# Altium footprint library ssmaster_1.PcbLib: 27 footprints (part 1 of 2)
Each footprint in its own frame and in the unit in brackets; x right, y up, seen from the top. Pads: shape width x height; smd on the part's side, far side on the other; paste and mask are expansions set on the pad; w line width, h text height; cw(c..) or ccw(c..) is an arc to the next point about the centre after c.
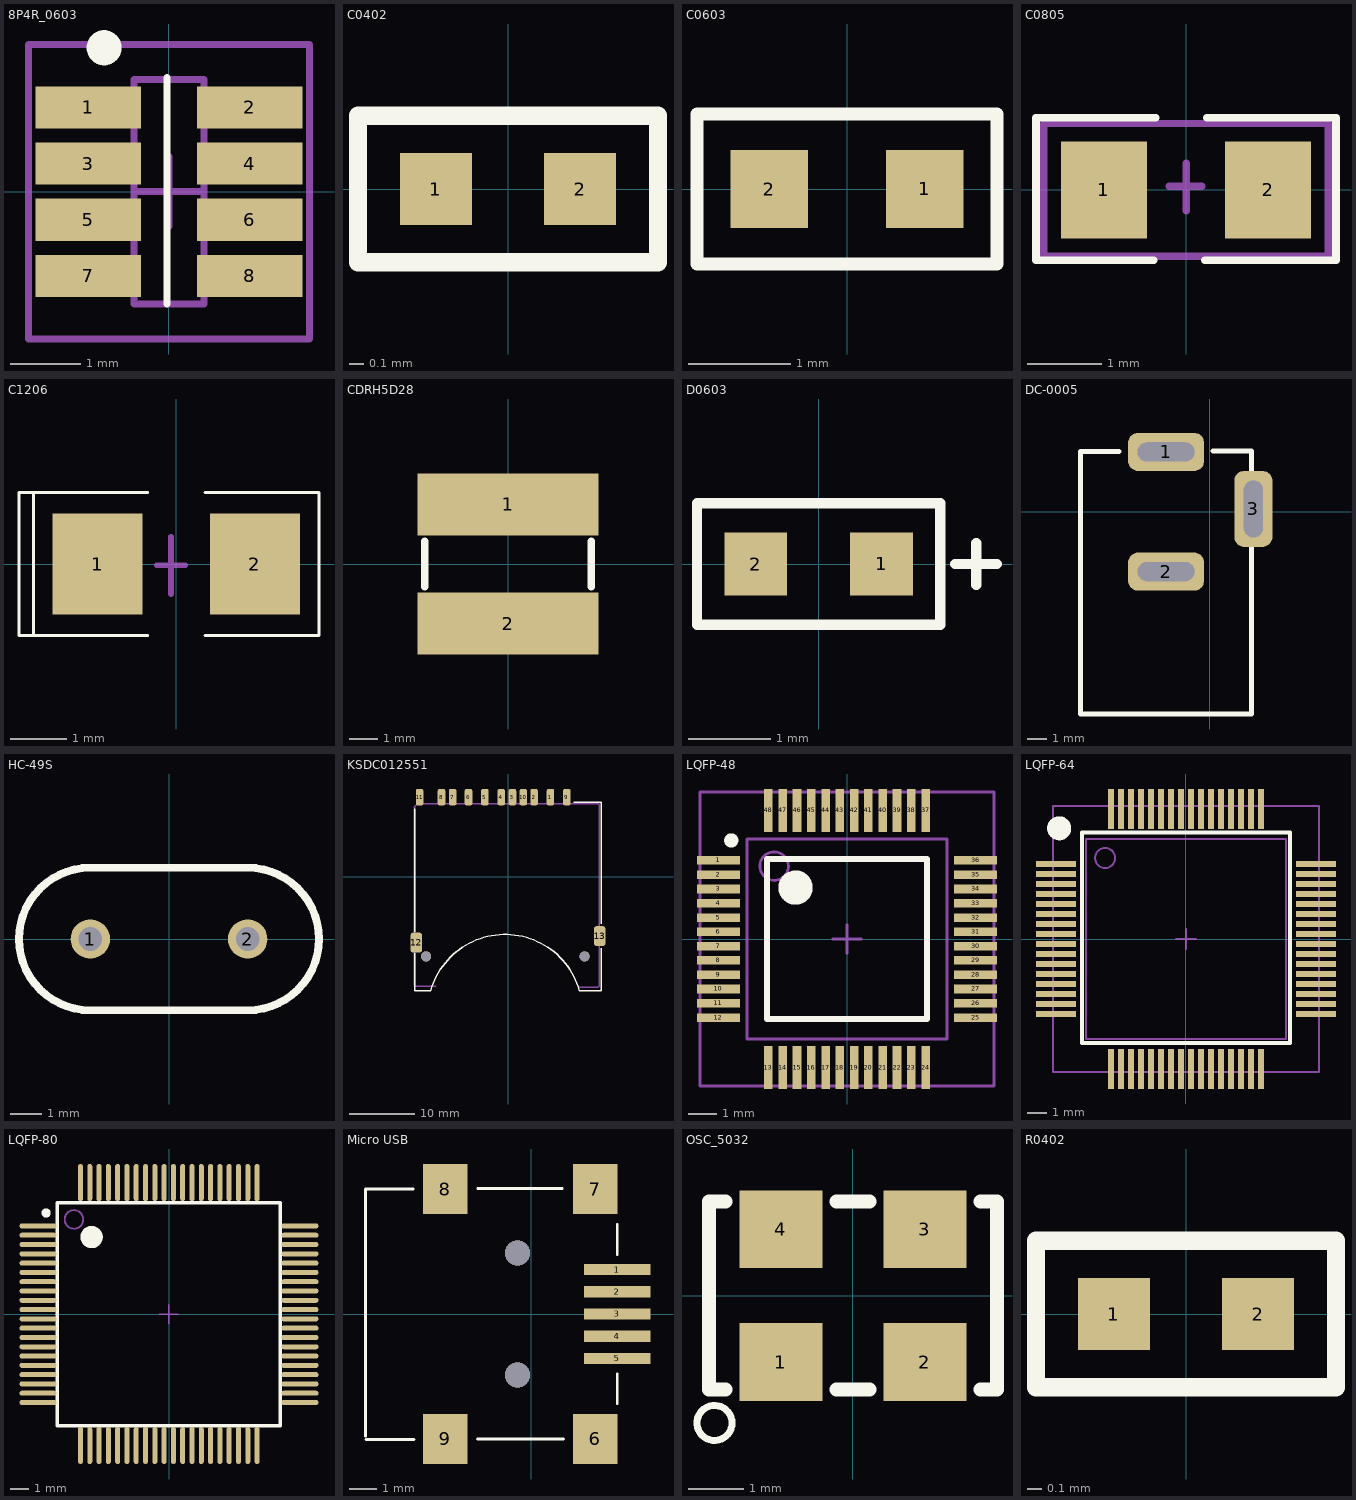
[diagram p0: the footprints below, top view; thin cyan lines are the x and y axes]

## 8P4R_0603 [mm]
pads (8):
  rect 1.5x0.6 smd: 1(-1.15,1.2) 2(1.15,1.2) 3(-1.15,0.4) 4(1.15,0.4) 5(-1.15,-0.4) 6(1.15,-0.4) 7(-1.15,-1.2) 8(1.15,-1.2)
Top Overlay:
  circle w0.25: c-0.925,2.05 r0.125
  lines w0.1: -0.025,-1.6 -0.025,1.626
Mechanical 13:
  lines w0.1: -0.5,-1.6 0.5,-1.6 0.5,1.6 -0.5,1.6 -0.5,-1.6
Mechanical 15:
  lines w0.1: -0.5,0 0.5,0 ; 0,-0.5 0,0.5 ; -2,-2.1 2,-2.1 2,2.1 -2,2.1 -2,-2.1
3D body: height 0.6, standoff 0.5, extent 0.483,-1.473 0.838,-0.914
3D body: height 0.15, standoff 0, extent 0.838,-1.473 1.219,-0.914
3D body: height 0.6, standoff 0, extent 0.813,-1.473 0.864,-0.914
3D body: height 0.6, standoff 0.5, extent 0.483,-0.686 0.838,-0.127
3D body: height 0.15, standoff 0, extent 0.838,-0.686 1.219,-0.127
3D body: height 0.6, standoff 0, extent 0.813,-0.686 0.864,-0.127
3D body: height 0.6, standoff 0.5, extent 0.483,0.127 0.838,0.686
3D body: height 0.15, standoff 0, extent 0.838,0.127 1.219,0.686
3D body: height 0.6, standoff 0, extent 0.813,0.127 0.864,0.686
3D body: height 0.6, standoff 0.5, extent 0.483,0.914 0.838,1.473
3D body: height 0.15, standoff 0, extent 0.838,0.914 1.219,1.473
3D body: height 0.6, standoff 0, extent 0.813,0.914 0.864,1.473
3D body: height 0.6, standoff 0, extent -0.864,-1.473 -0.813,-0.914
3D body: height 0.15, standoff 0, extent -1.219,-1.473 -0.838,-0.914
3D body: height 0.6, standoff 0.5, extent -0.838,-1.473 -0.483,-0.914
3D body: height 0.6, standoff 0, extent -0.864,-0.686 -0.813,-0.127
3D body: height 0.15, standoff 0, extent -1.219,-0.686 -0.838,-0.127
3D body: height 0.6, standoff 0.5, extent -0.838,-0.686 -0.483,-0.127
3D body: height 0.6, standoff 0, extent -0.864,0.127 -0.813,0.686
3D body: height 0.15, standoff 0, extent -1.219,0.127 -0.838,0.686
3D body: height 0.6, standoff 0.5, extent -0.838,0.127 -0.483,0.686
3D body: height 0.6, standoff 0, extent -0.864,0.914 -0.813,1.473
3D body: height 0.15, standoff 0, extent -1.219,0.914 -0.838,1.473
3D body: height 0.6, standoff 0.5, extent -0.838,0.914 -0.483,1.473
3D body: height 0.6, standoff 0.1, extent -0.5,-1.6 0.5,1.6

## C0402 [mm]
height 0.5
pads (2):
  rect 0.5x0.5 smd: 1(-0.5,0) 2(0.5,0)
Top Overlay:
  lines w0.127: 0.229,-0.508 1.041,-0.508 ; 1.041,-0.508 -1.041,-0.508 -1.041,0.508 1.041,0.508 1.041,-0.508
3D body: height 0.5, standoff -0.01, extent -0.5,-0.254 0.5,0.256

## C0603 [mil]
height 35.04
pads (2):
  rect 30x30 smd: 1(30,0) 2(-30,0)
Top Overlay:
  lines w5: -58,-29 58,-29 58,29 -58,29 -58,-29
3D body: height 35.28, standoff -0.15, extent -31.99,-15.94 31,15.94

## C0805 [mm]
height 0.5
pads (2):
  rect 1.15x1.3 smd: 1(-1.1,0) 2(1.1,0)
Top Overlay:
  lines w0.102: -0.432,-0.94 -2.007,-0.94 -2.007,0.965 -0.406,0.965 ; 0.254,-0.94 2.007,-0.94 2.007,0.965 0.279,0.965
Mechanical 15:
  lines w0.1: -0.222,0.051 0.006,0.051 ; 0.006,-0.279 0.006,0.356 ; 0.006,0.025 0.006,0.051 ; 0.21,0.051 0.006,0.051 ; -1.905,-0.889 -1.905,0.889 1.905,0.889 1.905,-0.889 -1.905,-0.889
3D body: height 0.5, standoff -0.01, extent -0.975,-0.61 1.025,0.6

## C1206 [mm]
height 1
pads (2):
  rect 1.6x1.8 smd: 1(-1.4,0) 2(1.4,0)
Top Overlay:
  lines w0.051: -0.508,-1.27 -2.54,-1.27 ; -0.508,1.27 -2.54,1.27 ; 0.508,-1.27 2.54,-1.27 2.54,1.27 0.508,1.27 ; -2.54,-1.27 -2.54,1.27 ; -2.54,-1.27 -2.8,-1.27 -2.8,1.27 -2.54,1.27
Mechanical 15:
  lines w0.1: -0.349,-0.025 0.159,-0.025 ; -0.095,-0.533 -0.095,0.483
3D body: height 1.02, standoff 0.01, extent -1.575,-0.813 1.625,0.797

## CDRH5D28 [mm]
pads (2):
  rect 6.3x2.15 smd: 1(0,2.075) 2(0,-2.075)
Top Overlay:
  lines w0.254: -2.9,-0.8 -2.9,0.8 ; 2.9,-0.8 2.9,0.8

## D0603 [mil]
height 35.04
pads (2):
  rect 30x30 smd: 1(30,0) 2(-30,0)
Top Overlay:
  lines w5: 65,0 85,0 ; 75,-10 75,10 ; -58,-29 -58,29 58,29 58,-29 -58,-29
3D body: height 35.28, standoff -0.15, extent -31.99,-15.94 31,15.94

## DC-0005 [mm]
pads (3):
  rrect50% 4x2 hole 1 slot 3 at 0 deg: 1(-2.3,3.15) 2(-2.3,-3.15)
  rrect50% 2x4 hole 1 slot 3 at 90 deg: 3(2.3,0.15)
Top Overlay:
  lines w0.254: -4.782,3.168 -6.8,3.168 -6.8,-10.65 2.2,-10.65 2.2,-1.85 ; 0.157,3.193 2.2,3.193 2.2,2.15
3D body: height 11.02, standoff -3.48, extent -6.803,-10.633 2.703,3.193

## HC-49S [mil]
pads (2):
  round 50 hole 30: 1(-100,0) 2(100,0)
Top Overlay:
  lines w10: -100,-90.55 cw(c-100,0) -100,90.55 100,90.55 cw(c100,0) 100,-90.55 -100,-90.55
3D body: height 138.4, standoff -156.88, extent -224.43,-90 222.43,93.07

## KSDC012551 [mm] "SD Card socket"
height 2.75
pads (15):
  rrect50% 1.16x2.5 smd: 1(6.48,12.15) 2(3.98,12.15) 3(0.68,12.15) 4(-1.03,12.15) 5(-3.53,12.15) 6(-6.03,12.15) 7(-8.45,12.15) 8(-10.15,12.15) 9(8.98,12.15) 10(2.33,12.15) 11(-13.5,12.15)
  rrect50% 1.8x3.048 smd: 12(-14,-10.05) 13(14,-9.05)
  round 1.55 hole 1.55 unplated: MH1(-12.5,-12.15) MH2(11.7,-12.15)
Top Overlay:
  lines w0.2: -14.22,-11.7 -14.22,-17.4 -11.799,-17.4 cw(c-0.441,-20.6) 10.915,-17.396 14.216,-17.396 14.22,-17.391 14.22,-10.9 ; -14.22,-8.4 -14.22,10.4 ; 10,11.4 14.22,11.4 14.22,-7.2
Mechanical 1:
  lines w0.254: -13.813,11.146 13.848,11.146
Mechanical 13:
  lines w0.254: -13.813,11.146 -14.275,10.684 -14.275,-16.586 -14.122,-16.739 -11.024,-16.739 ; 10.871,-16.866 13.716,-16.866 13.919,-16.662 13.919,11.024
3D body: height 2.38, standoff 0, extent -13.303,11.468 -13.105,12.426
3D body: height 2.4, standoff 2, extent -13.299,9.243 -13.108,12.426
3D body: height 2.4, standoff 2, extent -10.419,8.813 -9.826,11.996
3D body: height 2.38, standoff 0, extent -10.419,11.375 -9.826,11.996
3D body: height 0.3, standoff 0, extent -10.419,11.558 -9.831,12.476
3D body: height 2.4, standoff 2, extent -8.782,8.813 -8.189,11.996
3D body: height 2.38, standoff 0, extent -8.782,11.375 -8.189,11.996
3D body: height 0.3, standoff 0, extent -8.782,11.558 -8.194,12.476
3D body: height 2.4, standoff 2, extent -6.319,8.872 -5.726,12.055
3D body: height 2.38, standoff 0, extent -6.319,11.434 -5.726,12.055
3D body: height 0.3, standoff 0, extent -6.319,11.617 -5.731,12.535
3D body: height 2.4, standoff 2, extent -3.767,8.872 -3.174,12.055
3D body: height 2.38, standoff 0, extent -3.767,11.434 -3.174,12.055
3D body: height 0.3, standoff 0, extent -3.767,11.617 -3.179,12.535
3D body: height 2.4, standoff 2, extent -1.334,8.901 -0.741,12.084
3D body: height 2.38, standoff 0, extent -1.334,11.463 -0.741,12.084
3D body: height 0.3, standoff 0, extent -1.334,11.646 -0.746,12.564
3D body: height 2.4, standoff 2, extent 0.348,8.916 0.941,12.099
3D body: height 2.38, standoff 0, extent 0.348,11.478 0.941,12.099
3D body: height 0.3, standoff 0, extent 0.348,11.661 0.936,12.579
3D body: height 2.4, standoff 2, extent 1.985,9.078 2.578,12.261
3D body: height 2.38, standoff 0, extent 1.985,11.64 2.578,12.261
3D body: height 0.3, standoff 0, extent 1.985,11.823 2.573,12.741
3D body: height 2.4, standoff 2, extent 3.681,8.931 4.274,12.114
3D body: height 2.38, standoff 0, extent 3.681,11.493 4.274,12.114
3D body: height 0.3, standoff 0, extent 3.681,11.676 4.269,12.594
3D body: height 2.4, standoff 2, extent 6.144,8.975 6.737,12.158
3D body: height 2.38, standoff 0, extent 6.144,11.537 6.737,12.158
3D body: height 0.3, standoff 0, extent 6.144,11.72 6.732,12.638
3D body: height 2.8, standoff 0, extent -14.222,8.169 -13.997,9.117
3D body: height 2.8, standoff 0, extent 14,-10.435 14.316,-9.408
3D body: height 2.8, standoff 0, extent -14.214,-11.321 -13.79,-8.869
3D body: height 2, standoff 0, extent 13.597,-16.285 13.854,-7.771
3D body: height 2.9, standoff 0, extent 13.459,-7.804 13.864,11.131
3D body: height 2.9, standoff 0, extent 1.965,9.929 6.383,11.215
3D body: height 2.9, standoff 0, extent -4.663,9.85 -1.13,11.166
3D body: height 2.9, standoff 0, extent -13.049,9.658 -8.812,11.288
3D body: height 2.8, standoff 0, extent -13.951,10.009 13.519,11.146
3D body: height 2, standoff 0.3, extent -14.319,-16.403 -13.952,8.17
3D body: height 0.3, standoff 0, extent 8.67,11.684 9.258,12.602
3D body: height 2.38, standoff 0, extent 8.67,11.501 9.263,12.122
3D body: height 2.4, standoff 2, extent 8.67,8.939 9.263,12.122
3D body: height 0.3, standoff 0, extent -13.954,11.463 -13.108,12.406
3D body: height 2.23, standoff 0.13, extent -11.912,-21.529 12.088,10.471
3D body: height 0.89, standoff 0.03, extent -14.159,-16.685 13.959,11.026
3D body: height 2.9, standoff 2.59, extent -14.402,-17.018 13.97,10.871

## LQFP-48 [mm]
height 1.6
pads (48):
  rect 1.5x0.3 smd: 1(-4.5,2.75) 2(-4.5,2.25) 3(-4.5,1.75) 4(-4.5,1.25) 5(-4.5,0.75) 6(-4.5,0.25) 7(-4.5,-0.25) 8(-4.5,-0.75) 9(-4.5,-1.25) 10(-4.5,-1.75) 11(-4.5,-2.25) 12(-4.5,-2.75) 25(4.5,-2.75) 26(4.5,-2.25) 27(4.5,-1.75) 28(4.5,-1.25) 29(4.5,-0.75) 30(4.5,-0.25) 31(4.5,0.25) 32(4.5,0.75) 33(4.5,1.25) 34(4.5,1.75) 35(4.5,2.25) 36(4.5,2.75)
  rect 0.3x1.5 smd: 13(-2.75,-4.5) 14(-2.25,-4.5) 15(-1.75,-4.5) 16(-1.25,-4.5) 17(-0.75,-4.5) 18(-0.25,-4.5) 19(0.25,-4.5) 20(0.75,-4.5) 21(1.25,-4.5) 22(1.75,-4.5) 23(2.25,-4.5) 24(2.75,-4.5) 37(2.75,4.5) 38(2.25,4.5) 39(1.75,4.5) 40(1.25,4.5) 41(0.75,4.5) 42(0.25,4.5) 43(-0.25,4.5) 44(-0.75,4.5) 45(-1.25,4.5) 46(-1.75,4.5) 47(-2.25,4.5) 48(-2.75,4.5)
Top Overlay:
  circle w0.6: c-1.8,1.8 r0.3
  circle w0.25: c-4.05,3.45 r0.125
  lines w0.2: -2.8,-2.8 2.8,-2.8 2.8,2.8 -2.8,2.8 -2.8,-2.8
Mechanical 13:
  circle w0.1: c-2.55,2.55 r0.5
  lines w0.1: -3.5,-3.5 -3.5,3.5 3.5,3.5 3.5,-3.5 -3.5,-3.5
Mechanical 15:
  lines w0.1: -0.5,0 0.5,0 ; 0,-0.5 0,0.5 ; -5.15,-5.15 5.15,-5.15 5.15,5.15 -5.15,5.15 -5.15,-5.15
3D body: height 1.4, standoff -0.01, extent -4.405,-4.445 4.405,4.381

## LQFP-64 [mm]
height 1.6
pads (64):
  rect 2x0.3 smd: 1(-6.5,3.75) 2(-6.5,3.25) 3(-6.5,2.75) 4(-6.5,2.25) 5(-6.5,1.75) 6(-6.5,1.25) 7(-6.5,0.75) 8(-6.5,0.25) 9(-6.5,-0.25) 10(-6.5,-0.75) 11(-6.5,-1.25) 12(-6.5,-1.75) 13(-6.5,-2.25) 14(-6.5,-2.75) 15(-6.5,-3.25) 16(-6.5,-3.75) 33(6.5,-3.75) 34(6.5,-3.25) 35(6.5,-2.75) 36(6.5,-2.25) 37(6.5,-1.75) 38(6.5,-1.25) 39(6.5,-0.75) 40(6.5,-0.25) 41(6.5,0.25) 42(6.5,0.75) 43(6.5,1.25) 44(6.5,1.75) 45(6.5,2.25) 46(6.5,2.75) 47(6.5,3.25) 48(6.5,3.75)
  rect 0.3x2 smd: 17(-3.75,-6.5) 18(-3.25,-6.5) 19(-2.75,-6.5) 20(-2.25,-6.5) 21(-1.75,-6.5) 22(-1.25,-6.5) 23(-0.75,-6.5) 24(-0.25,-6.5) 25(0.25,-6.5) 26(0.75,-6.5) 27(1.25,-6.5) 28(1.75,-6.5) 29(2.25,-6.5) 30(2.75,-6.5) 31(3.25,-6.5) 32(3.75,-6.5) 49(3.75,6.5) 50(3.25,6.5) 51(2.75,6.5) 52(2.25,6.5) 53(1.75,6.5) 54(1.25,6.5) 55(0.75,6.5) 56(0.25,6.5) 57(-0.25,6.5) 58(-0.75,6.5) 59(-1.25,6.5) 60(-1.75,6.5) 61(-2.25,6.5) 62(-2.75,6.5) 63(-3.25,6.5) 64(-3.75,6.5)
Top Overlay:
  circle w0.6: c-6.345,5.537 r0.3
  lines w0.2: -5.207,-5.207 5.207,-5.207 5.207,5.334 -5.207,5.334 -5.207,-5.207
Mechanical 13:
  circle w0.1: c-4.05,4.05 r0.5
  lines w0.1: -5,-5 -5,5 5,5 5,-5 -5,-5
Mechanical 15:
  lines w0.1: -0.5,0 0.5,0 ; 0,-0.5 0,0.5 ; -6.65,-6.65 -6.65,6.65 6.65,6.65 6.65,-6.65 -6.65,-6.65
3D body: height 1.66, standoff 0, extent -6.019,-5.994 5.994,6.022

## LQFP-80 [mm]
height 1.6
pads (80):
  oval 2x0.27 smd: 1(-7.044,4.737) 2(-7.044,4.237) 3(-7.044,3.737) 4(-7.044,3.237) 5(-7.044,2.737) 6(-7.044,2.237) 7(-7.044,1.737) 8(-7.044,1.237) 9(-7.044,0.737) 10(-7.044,0.237) 11(-7.044,-0.263) 12(-7.044,-0.763) 13(-7.044,-1.263) 14(-7.044,-1.763) 15(-7.044,-2.263) 16(-7.044,-2.763) 17(-7.044,-3.263) 18(-7.044,-3.763) 19(-7.044,-4.263) 20(-7.044,-4.763) 41(7.044,-4.763) 42(7.044,-4.263) 43(7.044,-3.763) 44(7.044,-3.263) 45(7.044,-2.763) 46(7.044,-2.263) 47(7.044,-1.763) 48(7.044,-1.263) 49(7.044,-0.763) 50(7.044,-0.263) 51(7.044,0.237) 52(7.044,0.737) 53(7.044,1.237) 54(7.044,1.737) 55(7.044,2.237) 56(7.044,2.737) 57(7.044,3.237) 58(7.044,3.737) 59(7.044,4.237) 60(7.044,4.737)
  oval 0.27x2 smd: 21(-4.763,-7.07) 22(-4.263,-7.07) 23(-3.763,-7.07) 24(-3.263,-7.07) 25(-2.763,-7.07) 26(-2.263,-7.07) 27(-1.763,-7.07) 28(-1.263,-7.07) 29(-0.763,-7.07) 30(-0.263,-7.07) 31(0.237,-7.07) 32(0.737,-7.07) 33(1.237,-7.07) 34(1.737,-7.07) 35(2.237,-7.07) 36(2.737,-7.07) 37(3.237,-7.07) 38(3.737,-7.07) 39(4.237,-7.07) 40(4.737,-7.07) 61(4.737,7.07) 62(4.237,7.07) 63(3.737,7.07) 64(3.237,7.07) 65(2.737,7.07) 66(2.237,7.07) 67(1.737,7.07) 68(1.237,7.07) 69(0.737,7.07) 70(0.237,7.07) 71(-0.263,7.07) 72(-0.763,7.07) 73(-1.263,7.07) 74(-1.763,7.07) 75(-2.263,7.07) 76(-2.763,7.07) 77(-3.263,7.07) 78(-3.763,7.07) 79(-4.263,7.07) 80(-4.763,7.07)
Top Overlay:
  circle w0.25: c-6.613,5.437 r0.125
  circle w0.6: c-4.163,4.137 r0.3
  lines w0.2: -6.013,-6.013 -6.013,5.987 5.987,5.987 5.987,-6.013 -6.013,-6.013
Mechanical 13:
  circle w0.1: c-5.113,5.087 r0.5
  lines w0.1: -6.013,-6.013 5.987,-6.013 5.987,5.987 -6.013,5.987
Mechanical 15:
  lines w0.1: -0.513,-0.013 0.487,-0.013 ; -0.013,-0.513 -0.013,0.487
3D body: height 1.69, standoff 0.01, extent -7.01,-7.036 7.017,6.987

## Micro USB [mm]
pads (9):
  rect 2.4x0.4 smd: 1(3.1,1.6) 2(3.1,0.8) 3(3.1,0) 4(3.1,-0.8) 5(3.1,-1.6)
  rect 1.6x1.8 smd: 6(2.3,-4.5) 7(2.3,4.5) 8(-3.1,4.5) 9(-3.1,-4.5)
via -0.5,-2.2 diameter 0.9 hole 0.9
via -0.5,2.2 diameter 0.9 hole 0.9
Top Overlay:
  lines w0.1: -5.969,-4.4 -5.969,4.5 -4.242,4.5 ; -5.944,-4.521 -4.216,-4.521 ; -1.93,-4.496 1.168,-4.496 ; -1.92,4.521 1.118,4.521 ; 3.099,-3.226 3.099,-2.159 ; 3.099,2.134 3.099,3.226
3D body: height 3.95, standoff -1, extent -5.918,-5.325 3.282,5.375

## OSC_5032 [mm]
pads (4):
  rect 1.5x1.4 smd: 1(-1.3,-1.2) 2(1.3,-1.2) 3(1.3,1.2) 4(-1.3,1.2)
Top Overlay:
  circle w0.127: c-2.5,-2.3 r0.316
  lines w0.254: -2.3,-1.7 -2.6,-1.7 -2.6,1.7 -2.3,1.7 ; -0.3,-1.7 0.3,-1.7 ; -0.3,1.7 0.3,1.7 ; 2.3,-1.7 2.6,-1.7 2.6,1.7 2.3,1.7

## R0402 [mm]
height 0.5
pads (2):
  rect 0.5x0.5 smd: 1(-0.5,0) 2(0.5,0)
Top Overlay:
  lines w0.127: 0.229,-0.508 1.041,-0.508 ; 1.041,-0.508 1.041,0.508 -1.041,0.508 -1.041,-0.508 1.041,-0.508
3D body: height 0.5, standoff -0.01, extent -0.483,-0.255 0.517,0.255